# Altium footprint library BrewController.PcbLib: 14 footprints
Each footprint in its own frame and in the unit in brackets; x right, y up, seen from the top. Pads: shape width x height; smd on the part's side, far side on the other; paste and mask are expansions set on the pad; w line width, h text height; cw(c..) or ccw(c..) is an arc to the next point about the centre after c.
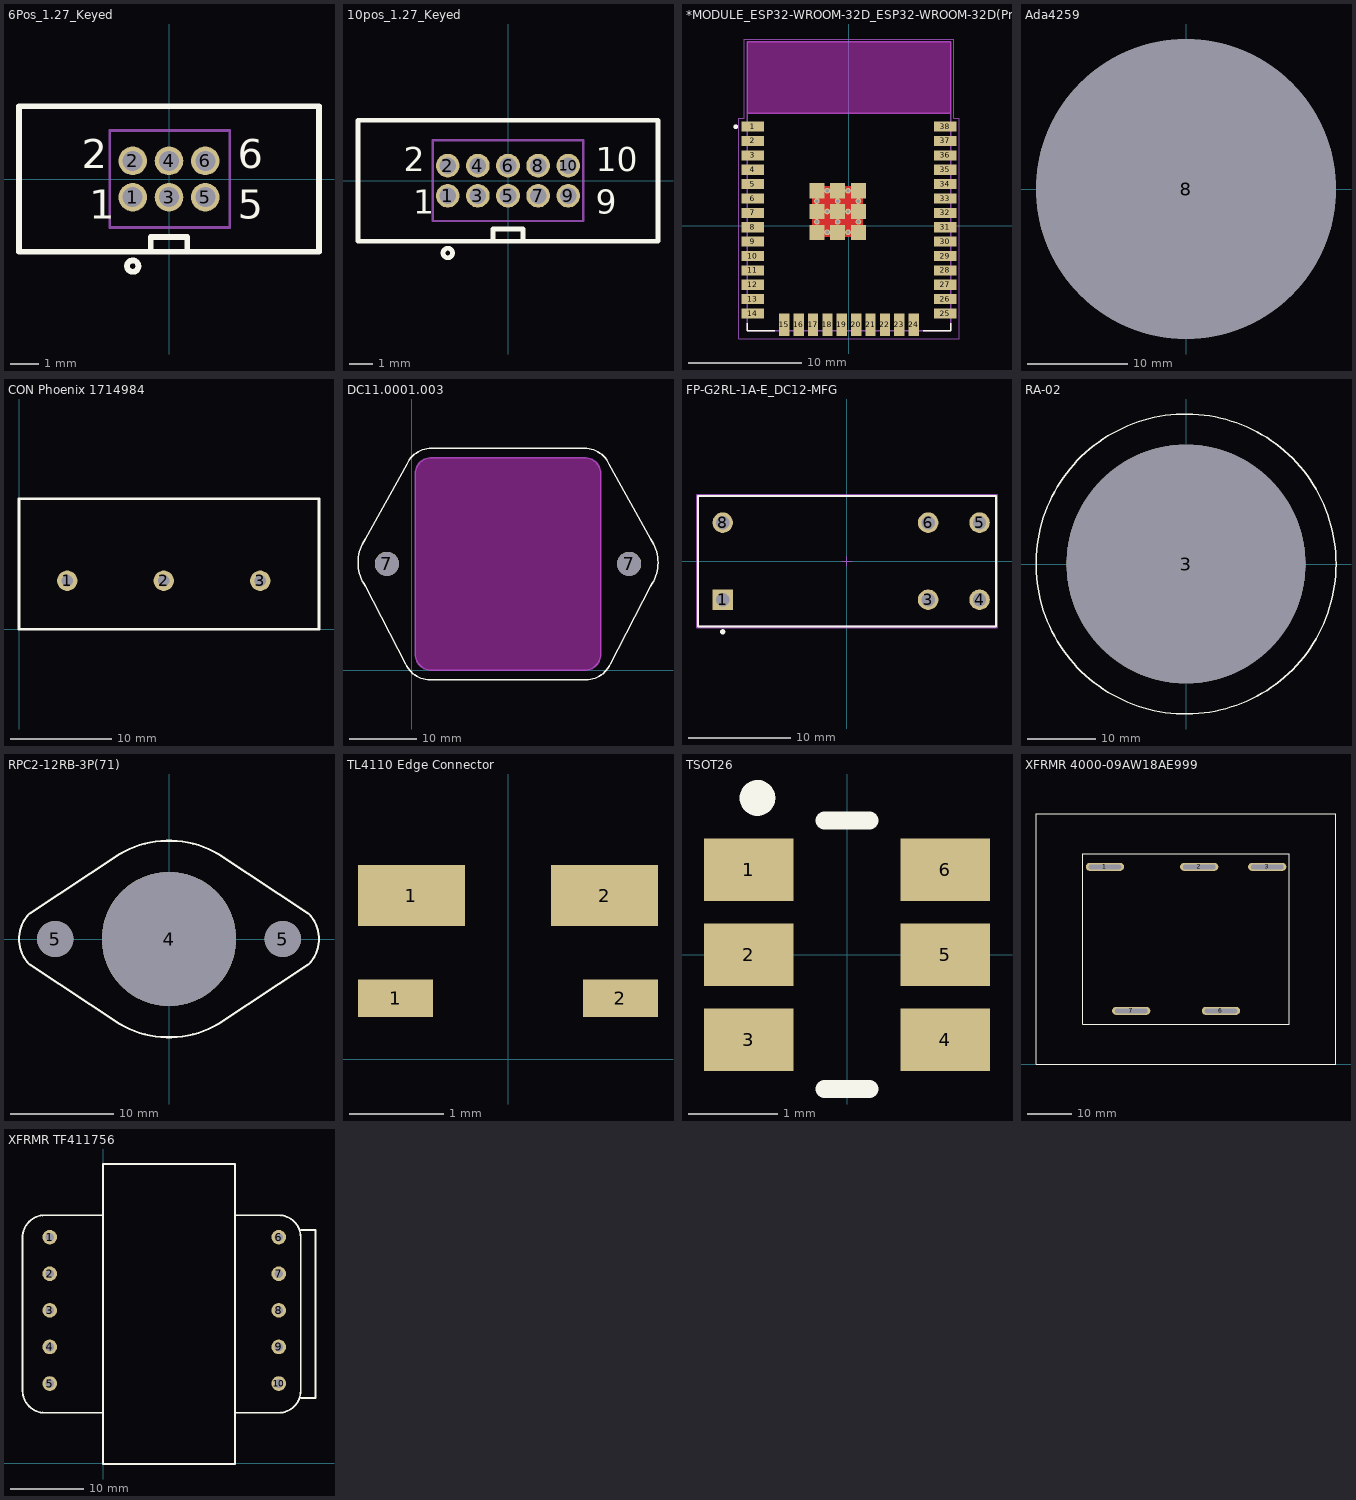
[diagram p0: the footprints below, top view; thin cyan lines are the x and y axes]

## 6Pos_1.27_Keyed [mm]
pads (6):
  round 1 hole 0.7: 1(-1.27,-0.635) 2(-1.27,0.635) 3(0,-0.635) 4(0,0.635) 6(1.27,0.635)
  round 1 hole 0.7 mask+0.102: 5(1.27,-0.635)
Top Overlay:
  circle w0.2: c-1.27,-3.048 r0.2
  lines w0.2: -0.635,-2.54 -0.635,-2.032 0.635,-2.032 0.635,-2.54 ; -5.25,-2.55 5.25,-2.55 5.25,2.55 -5.25,2.55 -5.25,-2.55
  text "2" at -3.048,0.381 h1.02
  text "1" at -2.794,-1.397 h1.02
  text "6" at 2.413,0.381 h1.02
  text "5" at 2.413,-1.397 h1.02
Mechanical 13:
  lines w0.1: -2.075,-1.7 2.125,-1.7 2.125,1.7 -2.075,1.7 -2.075,-1.7

## 10pos_1.27_Keyed [mm]
pads (10):
  round 1 hole 0.7: 1(-2.54,-0.635) 2(-2.54,0.635) 3(-1.27,-0.635) 4(-1.27,0.635) 6(0,0.635) 7(1.27,-0.635) 8(1.27,0.635) 9(2.54,-0.635) 10(2.54,0.635)
  round 1 hole 0.7 mask+0.102: 5(0,-0.635)
Top Overlay:
  circle w0.2: c-2.54,-3.048 r0.2
  lines w0.2: -0.635,-2.54 -0.635,-2.032 0.635,-2.032 0.635,-2.54 ; -6.325,-2.55 6.325,-2.55 6.325,2.55 -6.325,2.55 -6.325,-2.55
  text "2" at -4.405,0.4 h1.02
  text "1" at -4.005,-1.4 h1.02
  text "10" at 3.705,0.4 h1.02
  text "9" at 3.705,-1.4 h1.02
Mechanical 13:
  lines w0.1: -3.175,-1.7 3.175,-1.7 3.175,1.7 -3.175,1.7 -3.175,-1.7
3D body "62201021121.stp": height 5.33, standoff -2.27, extent -3.175,-1.7 3.175,1.7

## *MODULE_ESP32-WROOM-32D_ESP32-WROOM-32D(Primary) [mm]
pads (59):
  rect 2x0.9 smd: 1(-8.5,8.755) 2(-8.5,7.485) 3(-8.5,6.215) 4(-8.5,4.945) 5(-8.5,3.675) 6(-8.5,2.405) 7(-8.5,1.135) 8(-8.5,-0.135) 9(-8.5,-1.405) 10(-8.5,-2.675) 11(-8.5,-3.945) 12(-8.5,-5.215) 13(-8.5,-6.485) 14(-8.5,-7.755) 25(8.5,-7.755) 26(8.5,-6.485) 27(8.5,-5.215) 28(8.5,-3.945) 29(8.5,-2.675) 30(8.5,-1.405) 31(8.5,-0.135) 32(8.5,1.135) 33(8.5,2.405) 34(8.5,3.675) 35(8.5,4.945) 36(8.5,6.215) 37(8.5,7.485) 38(8.5,8.755)
  rect 0.9x2 smd: 15(-5.715,-8.755) 16(-4.445,-8.755) 17(-3.175,-8.755) 18(-1.905,-8.755) 19(-0.635,-8.755) 20(0.635,-8.755) 21(1.905,-8.755) 22(3.175,-8.755) 23(4.445,-8.755) 24(5.715,-8.755)
  rect 1.33x1.33 smd: 39_1(-2.835,3.09) 39_2(-1,3.09) 39_3(0.835,3.09) 39_4(-2.835,1.255) 39_5(-1,1.255) 39_6(0.835,1.255) 39_7(-2.835,-0.58) 39_8(-1,-0.58) 39_9(0.835,-0.58)
  round 0.5 hole 0.3: 39_10(-1.917,3.09) 39_11(-0.082,3.09) 39_12(-2.835,2.173) 39_13(-1,2.173) 39_14(0.835,2.173) 39_15(-1.917,1.255) 39_16(-0.082,1.255) 39_17(-2.835,0.338) 39_18(-1,0.338) 39_19(0.835,0.338) 39_20(-1.917,-0.58) 39_21(-0.082,-0.58)
Top Layer:
  rectangle: -3.25,-1 1.25,3.5
Top Overlay:
  circle w0.2: c-10,8.745 r0.1
  lines w0.127: -9,-8.605 -9,-9.255 -6.55,-9.255 ; 6.55,-9.255 9,-9.255 9,-8.605
Keep-Out Layer:
  region: -9,16.245 9,16.245 9,9.945 -9,9.945
  region: -9,16.245 9,16.245 9,9.945 -9,9.945
  region: -9,16.245 9,16.245 9,9.945 -9,9.945
  region: -9,16.245 9,16.245 9,9.945 -9,9.945
  region: -9,16.245 9,16.245 9,9.945 -9,9.945
  region: -9,16.245 9,16.245 9,9.945 -9,9.945
Mechanical 13:
  circle w0.2: c-10,8.745 r0.1
  circle w0.2: c-10,8.745 r0.1
  lines w0.127: -9,-9.255 9,-9.255 ; -9,-9.255 -9,9.945 ; -9,-9.255 9,-9.255 ; -9,-9.255 -9,9.945 ; -9,9.945 -9,16.245 ; -9,9.945 9,9.945 ; -9,9.945 -9,16.245 ; -9,9.945 9,9.945 ; -9,16.245 9,16.245 ; -9,16.245 9,16.245 ; 9,-9.255 9,9.945 ; 9,-9.255 9,9.945 ; 9,9.945 9,16.245 ; 9,9.945 9,16.245
  text "ANTENNA" at -6,12.245 h1.88
  text "ANTENNA" at -6,12.245 h1.88
Mechanical 16:
  lines w0.05: -9.75,-10.005 9.75,-10.005 9.75,9.495 9.25,9.495 9.25,16.495 -9.25,16.495 -9.25,9.495 -9.75,9.495 -9.75,-10.005
3D body "User Library-ESP321.step": height 2.92, standoff 0.01, extent -9,-9.255 9,16.245

## Ada4259 [mm]
pads (1):
  round 30 hole 30 unplated: 8(0,0)

## CON Phoenix 1714984 [mm]
pads (3):
  round 2 hole 1.1: 1(4.76,4.8) 2(14.28,4.8) 3(23.8,4.8)
Top Overlay:
  lines w0.254: 0,0 0,12.9 29.6,12.9 29.6,0 0,0
3D body "pxc_1714984_04_MKDS-5-3-9-5_3D.stp": height 21.5, standoff -5, extent 0.215,0.2 29.345,12.7

## DC11.0001.003 [mm]
pads (2):
  round 3.6 hole 3.6 unplated: 7(-3.7,15.8) 7(32.3,15.8)
Top Overlay:
  lines w0.2: -6.915,12.559 cw(c-2,16) -6.915,19.441 -0.7,30.69 cw(c2.925,29) 2.925,33 25.675,33 cw(c25.675,29) 29.3,30.69 35.515,19.441 cw(c30.6,16) 35.515,12.559 29.5,0.875 cw(c25.875,2.565) 25.875,-1.435 2.725,-1.435 cw(c2.725,2.565) -0.9,0.875 -6.915,12.559
Keep-Out Layer:
  board cut-out: 0.5,29.2 0.5,29.436 0.592,29.9 0.773,30.337 1.036,30.73 1.37,31.064 1.763,31.327 2.2,31.508 2.664,31.6 2.9,31.6 25.7,31.6 25.936,31.6 26.4,31.508 26.837,31.327 27.23,31.064 27.564,30.73 27.827,30.337 28.008,29.9 28.1,29.436 28.1,29.2 28.1,2.4 28.1,2.164 28.008,1.7 27.827,1.263 27.564,0.87 27.23,0.536 26.837,0.273 26.4,0.092 25.936,0 25.7,0 2.9,0 2.664,0 2.2,0.092 1.763,0.273 1.37,0.536 1.036,0.87 0.773,1.263 0.592,1.7 0.5,2.164 0.5,2.4
  board cut-out: 0,29.2
Mechanical 2:
  lines w0.2: 0.5,2.4 ccw(c2.9,2.4) 2.9,0 25.7,0 ccw(c25.7,2.4) 28.1,2.4 28.1,29.2 ccw(c25.7,29.2) 25.7,31.6 2.9,31.6 ccw(c2.9,29.2) 0.5,29.2 0.5,2.4
Mechanical 13:
  lines w0.2: 0.5,2.4 ccw(c2.9,2.4) 2.9,0 25.7,0 ccw(c25.7,2.4) 28.1,2.4 28.1,29.2 ccw(c25.7,29.2) 25.7,31.6 2.9,31.6 ccw(c2.9,29.2) 0.5,29.2 0.5,2.4
3D body "e_0100.2390b002.step": height 4.2, standoff -32.25, extent -7.8,-1.2 36.2,32.8

## FP-G2RL-1A-E_DC12-MFG [mm]
pads (6):
  rect 2x2 hole 1.3 paste-1000 mask+0: 1(-12.1,-3.75)
  round 2 hole 1.3 paste-1000 mask+0: 3(7.9,-3.75) 4(12.9,-3.75) 5(12.9,3.75) 6(7.9,3.75) 8(-12.1,3.75)
Top Overlay:
  circle w0.25: c-12.1,-6.875 r0.125
  lines w0.2: -14.5,-6.35 14.5,-6.35 14.5,6.35 -14.5,6.35 -14.5,-6.35
Mechanical 5:
  lines w0.2: -14.6,-6.45 14.6,-6.45 14.6,6.45 -14.6,6.45 -14.6,-6.45
  text ".Designator" at 0,0.188 h1
Mechanical 13:
  lines w0.2: -14.5,-6.35 14.5,-6.35 14.5,6.35 -14.5,6.35 -14.5,-6.35
Mechanical 15:
  lines w0.2: -14.6,-6.45 14.6,-6.45 14.6,6.45 -14.6,6.45 -14.6,-6.45
Mechanical 16:
  lines w0.1: -0.5,0 0.5,0 ; 0,-0.5 0,0.5
3D body "Relay_Omron_G2RL-1A-E_DC5_eec.STEP": height 0.25, standoff 0, extent -14.6,-6.45 14.6,6.45

## RA-02 [mm]
pads (1):
  round 35 hole 35 unplated: 3(0,0)
Top Overlay:
  circle w0.2: c0,0 r22

## RELAY GEN PURPOSE SPST 16A 12V [mm]

## RPC2-12RB-3P(71) [mm]
pads (3):
  round 13 hole 13 unplated: 4(0,0)
  round 3.5 hole 3.5 unplated: 5(-11,0) 5(11,0)
Top Overlay:
  lines w0.2: -13.475,-2.475 cw(c-11,0) -13.475,2.475 -4.75,8.227 cw(c0,0) 4.75,8.227 13.475,2.475 cw(c11,0) 13.475,-2.475 4.75,-8.227 cw(c0,0) -4.75,-8.227 -13.475,-2.475
3D body "RPC2-12RB-3P.stp": height 12, standoff -10.5, extent -14.5,-9.5 14.5,9.5

## TL4110 Edge Connector [mm]
pads (4):
  rect 0.8x0.4 smd: 1(-1.2,0.65) 2(1.2,0.65)
  rect 1.14x0.65 smd: 1(-1.03,1.745) 2(1.03,1.745)
3D body "TL4110AF160Q.stp": height 1.02, standoff -1.02, extent -1.4,-0.587 1.4,2.063

## TSOT26 [mm]
height 1
pads (6):
  rect 1x0.7 smd mask+0.099: 1(-1.099,0.95) 2(-1.099,0) 3(-1.099,-0.95) 4(1.099,-0.95) 5(1.099,0) 6(1.099,0.95)
Top Overlay:
  circle w0.2: c-1,1.75 r0.1
  lines w0.2: -0.25,-1.5 0.25,-1.5 ; -0.25,1.5 0.25,1.5
3D body "User Library-ZXTC2045E6TA.STEP": height 1.4, standoff 0, extent -1.5,-1.55 1.5,1.55

## XFRMR 4000-09AW18AE999 [mm] "PWR XFMR LAMINATED 50VA CHAS MT"
pads (5):
  oval 8.5x1.75 hole 1 slot 7.2 at 0 deg: 1(27.178,43.815) 2(48.133,43.815) 3(63.246,43.815) 6(52.959,11.811) 7(33.02,11.811)
Top Overlay:
  lines w0.254: 11.859,0 78.534,0 78.534,55.575 11.859,55.575 11.859,0 ; 22.2,8.814 68.174,8.814 68.174,46.761 22.2,46.761 22.2,8.814
3D body "c-6-1611461-2-a-3d.stp": height 57, standoff -8.99, extent 0.1,0.112 90.575,55.688

## XFRMR TF411756 [mm]
pads (10):
  round 2 hole 1.2: 1(-7.3,30.9) 2(-7.3,25.9) 3(-7.3,20.9) 4(-7.3,15.9) 5(-7.3,10.9) 6(24,30.9) 7(24,25.9) 8(24,20.9) 9(24,15.9) 10(24,10.9)
Top Overlay:
  lines w0.254: -11,30.9 cw(c-8,30.9) -8,33.9 ; -11,31.2 -11,9.9 ccw(c-8,9.9) -8,6.9 0,6.9 ; -8.3,33.9 0,33.9 ; 18,6.9 24,6.9 ccw(c24,9.9) 27,9.9 ; 18,33.9 24,33.9 cw(c24,30.9) 27,30.9 27,9.7 ; 27,8.9 29,8.9 29,31.9 27,31.9 ; 0,-0.1 0,40.9 18,40.9 18,-0.1 0,-0.1
3D body: height 35, standoff 0, extent 0,-0.1 18,40.9
3D body: height 0.25, standoff -29.13, extent 29,8.9 29,8.9
3D body: height 25, standoff 0, extent -11,7.05 29,33.9